# Altium integrated library WCAP-ATLL_rev15a.intlib: 209 symbols (part 1 of 3) (continued)
## WCAP-ATLL 16x31.5x7.5x0.8 860160280048 (continued)
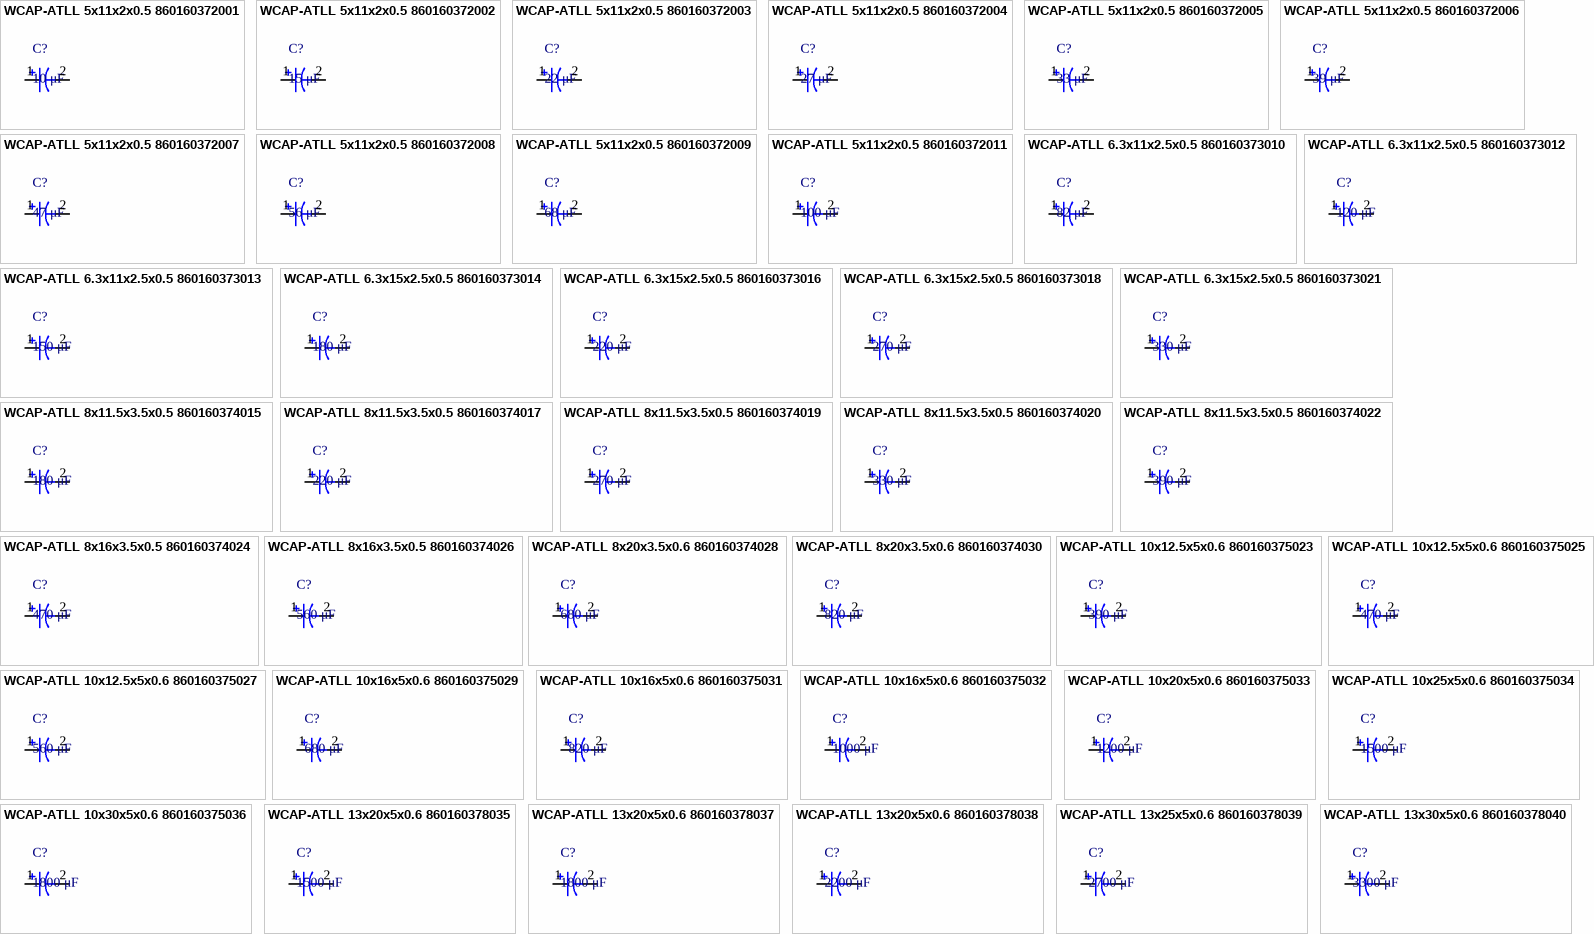
[diagram p2: symbols WCAP-ATLL 5x11x2x0.5 860160372001 to WCAP-ATLL 13x30x5x0.6 860160378040]

## WCAP-ATLL 5x11x2x0.5 860160372001
designator C?, comment 10 μF
WCAP-ATLL Aluminum Electrolytic Capacitors , 10 μF; + / - 20%; 16 V , 5 x 11; Manufacturer: Wurth Elektronik; partNo: 860160372001; E-mail: libraries@we-online.com; Characteristics: Aluminum Electrolytic Capacitor;Recommended soldering: Wave;Operating temperature: –55 °C to +105 °C;Low impedance and high temperature product series;Load life: 3000–10000 h @ +105 °C; ComponentLink1Description: Manufacturer; ComponentLink1URL: http://www.we-online.com; ComponentLink2Description: Datasheet; ComponentLink2URL: http://katalog.we-online.de/pbs/datasheet/860160372001.pdf; Created by: Karrer Zheng; Created Date: 5/13/2015; Capacitance: 10 μF; Application: Used in circuit with rigorous conditions and high ambient temperature;  applied to the secondary side output filtering loop, used in switching power supply with higher operating temperature, DC-DC converter, AC-DC converter, adapter, charger, TV, VCR, DC motor circuit filter, high-end switching power supply, LCD TV, energy saving lamps, electronic ballast, LED lamp and etc.
footprint WCAP-ATLL 5x11x2x0.5
pins: 1, 2

## WCAP-ATLL 5x11x2x0.5 860160372002
designator C?, comment 15 μF
WCAP-ATLL Aluminum Electrolytic Capacitors , 15 μF; + / - 20%; 16 V , 5 x 11; Manufacturer: Wurth Elektronik; partNo: 860160372002; E-mail: libraries@we-online.com; Characteristics: Aluminum Electrolytic Capacitor;Recommended soldering: Wave;Operating temperature: –55 °C to +105 °C;Low impedance and high temperature product series;Load life: 3000–10000 h @ +105 °C; ComponentLink1Description: Manufacturer; ComponentLink1URL: http://www.we-online.com; ComponentLink2Description: Datasheet; ComponentLink2URL: http://katalog.we-online.de/pbs/datasheet/860160372002.pdf; Created by: Karrer Zheng; Created Date: 5/13/2015; Capacitance: 15 μF; Application: Used in circuit with rigorous conditions and high ambient temperature;  applied to the secondary side output filtering loop, used in switching power supply with higher operating temperature, DC-DC converter, AC-DC converter, adapter, charger, TV, VCR, DC motor circuit filter, high-end switching power supply, LCD TV, energy saving lamps, electronic ballast, LED lamp and etc.
footprint WCAP-ATLL 5x11x2x0.5
pins: 1, 2

## WCAP-ATLL 5x11x2x0.5 860160372003
designator C?, comment 22 μF
WCAP-ATLL Aluminum Electrolytic Capacitors , 22 μF; + / - 20%; 16 V , 5 x 11; Manufacturer: Wurth Elektronik; partNo: 860160372003; E-mail: libraries@we-online.com; Characteristics: Aluminum Electrolytic Capacitor;Recommended soldering: Wave;Operating temperature: –55 °C to +105 °C;Low impedance and high temperature product series;Load life: 3000–10000 h @ +105 °C; ComponentLink1Description: Manufacturer; ComponentLink1URL: http://www.we-online.com; ComponentLink2Description: Datasheet; ComponentLink2URL: http://katalog.we-online.de/pbs/datasheet/860160372003.pdf; Created by: Karrer Zheng; Created Date: 5/13/2015; Capacitance: 22 μF; Application: Used in circuit with rigorous conditions and high ambient temperature;  applied to the secondary side output filtering loop, used in switching power supply with higher operating temperature, DC-DC converter, AC-DC converter, adapter, charger, TV, VCR, DC motor circuit filter, high-end switching power supply, LCD TV, energy saving lamps, electronic ballast, LED lamp and etc.
footprint WCAP-ATLL 5x11x2x0.5
pins: 1, 2

## WCAP-ATLL 5x11x2x0.5 860160372004
designator C?, comment 27 μF
WCAP-ATLL Aluminum Electrolytic Capacitors , 27 μF; + / - 20%; 16 V , 5 x 11; Manufacturer: Wurth Elektronik; partNo: 860160372004; E-mail: libraries@we-online.com; Characteristics: Aluminum Electrolytic Capacitor;Recommended soldering: Wave;Operating temperature: –55 °C to +105 °C;Low impedance and high temperature product series;Load life: 3000–10000 h @ +105 °C; ComponentLink1Description: Manufacturer; ComponentLink1URL: http://www.we-online.com; ComponentLink2Description: Datasheet; ComponentLink2URL: http://katalog.we-online.de/pbs/datasheet/860160372004.pdf; Created by: Karrer Zheng; Created Date: 5/13/2015; Capacitance: 27 μF; Application: Used in circuit with rigorous conditions and high ambient temperature;  applied to the secondary side output filtering loop, used in switching power supply with higher operating temperature, DC-DC converter, AC-DC converter, adapter, charger, TV, VCR, DC motor circuit filter, high-end switching power supply, LCD TV, energy saving lamps, electronic ballast, LED lamp and etc.
footprint WCAP-ATLL 5x11x2x0.5
pins: 1, 2

## WCAP-ATLL 5x11x2x0.5 860160372005
designator C?, comment 33 μF
WCAP-ATLL Aluminum Electrolytic Capacitors , 33 μF; + / - 20%; 16 V , 5 x 11; Manufacturer: Wurth Elektronik; partNo: 860160372005; E-mail: libraries@we-online.com; Characteristics: Aluminum Electrolytic Capacitor;Recommended soldering: Wave;Operating temperature: –55 °C to +105 °C;Low impedance and high temperature product series;Load life: 3000–10000 h @ +105 °C; ComponentLink1Description: Manufacturer; ComponentLink1URL: http://www.we-online.com; ComponentLink2Description: Datasheet; ComponentLink2URL: http://katalog.we-online.de/pbs/datasheet/860160372005.pdf; Created by: Karrer Zheng; Created Date: 5/13/2015; Capacitance: 33 μF; Application: Used in circuit with rigorous conditions and high ambient temperature;  applied to the secondary side output filtering loop, used in switching power supply with higher operating temperature, DC-DC converter, AC-DC converter, adapter, charger, TV, VCR, DC motor circuit filter, high-end switching power supply, LCD TV, energy saving lamps, electronic ballast, LED lamp and etc.
footprint WCAP-ATLL 5x11x2x0.5
pins: 1, 2

## WCAP-ATLL 5x11x2x0.5 860160372006
designator C?, comment 39 μF
WCAP-ATLL Aluminum Electrolytic Capacitors , 39 μF; + / - 20%; 16 V , 5 x 11; Manufacturer: Wurth Elektronik; partNo: 860160372006; E-mail: libraries@we-online.com; Characteristics: Aluminum Electrolytic Capacitor;Recommended soldering: Wave;Operating temperature: –55 °C to +105 °C;Low impedance and high temperature product series;Load life: 3000–10000 h @ +105 °C; ComponentLink1Description: Manufacturer; ComponentLink1URL: http://www.we-online.com; ComponentLink2Description: Datasheet; ComponentLink2URL: http://katalog.we-online.de/pbs/datasheet/860160372006.pdf; Created by: Karrer Zheng; Created Date: 5/13/2015; Capacitance: 39 μF; Application: Used in circuit with rigorous conditions and high ambient temperature;  applied to the secondary side output filtering loop, used in switching power supply with higher operating temperature, DC-DC converter, AC-DC converter, adapter, charger, TV, VCR, DC motor circuit filter, high-end switching power supply, LCD TV, energy saving lamps, electronic ballast, LED lamp and etc.
footprint WCAP-ATLL 5x11x2x0.5
pins: 1, 2

## WCAP-ATLL 5x11x2x0.5 860160372007
designator C?, comment 47 μF
WCAP-ATLL Aluminum Electrolytic Capacitors , 47 μF; + / - 20%; 16 V , 5 x 11; Manufacturer: Wurth Elektronik; partNo: 860160372007; E-mail: libraries@we-online.com; Characteristics: Aluminum Electrolytic Capacitor;Recommended soldering: Wave;Operating temperature: –55 °C to +105 °C;Low impedance and high temperature product series;Load life: 3000–10000 h @ +105 °C; ComponentLink1Description: Manufacturer; ComponentLink1URL: http://www.we-online.com; ComponentLink2Description: Datasheet; ComponentLink2URL: http://katalog.we-online.de/pbs/datasheet/860160372007.pdf; Created by: Karrer Zheng; Created Date: 5/13/2015; Capacitance: 47 μF; Application: Used in circuit with rigorous conditions and high ambient temperature;  applied to the secondary side output filtering loop, used in switching power supply with higher operating temperature, DC-DC converter, AC-DC converter, adapter, charger, TV, VCR, DC motor circuit filter, high-end switching power supply, LCD TV, energy saving lamps, electronic ballast, LED lamp and etc.
footprint WCAP-ATLL 5x11x2x0.5
pins: 1, 2

## WCAP-ATLL 5x11x2x0.5 860160372008
designator C?, comment 56 μF
WCAP-ATLL Aluminum Electrolytic Capacitors , 56 μF; + / - 20%; 16 V , 5 x 11; Manufacturer: Wurth Elektronik; partNo: 860160372008; E-mail: libraries@we-online.com; Characteristics: Aluminum Electrolytic Capacitor;Recommended soldering: Wave;Operating temperature: –55 °C to +105 °C;Low impedance and high temperature product series;Load life: 3000–10000 h @ +105 °C; ComponentLink1Description: Manufacturer; ComponentLink1URL: http://www.we-online.com; ComponentLink2Description: Datasheet; ComponentLink2URL: http://katalog.we-online.de/pbs/datasheet/860160372008.pdf; Created by: Karrer Zheng; Created Date: 5/13/2015; Capacitance: 56 μF; Application: Used in circuit with rigorous conditions and high ambient temperature;  applied to the secondary side output filtering loop, used in switching power supply with higher operating temperature, DC-DC converter, AC-DC converter, adapter, charger, TV, VCR, DC motor circuit filter, high-end switching power supply, LCD TV, energy saving lamps, electronic ballast, LED lamp and etc.
footprint WCAP-ATLL 5x11x2x0.5
pins: 1, 2

## WCAP-ATLL 5x11x2x0.5 860160372009
designator C?, comment 68 μF
WCAP-ATLL Aluminum Electrolytic Capacitors , 68 μF; + / - 20%; 16 V , 5 x 11; Manufacturer: Wurth Elektronik; partNo: 860160372009; E-mail: libraries@we-online.com; Characteristics: Aluminum Electrolytic Capacitor;Recommended soldering: Wave;Operating temperature: –55 °C to +105 °C;Low impedance and high temperature product series;Load life: 3000–10000 h @ +105 °C; ComponentLink1Description: Manufacturer; ComponentLink1URL: http://www.we-online.com; ComponentLink2Description: Datasheet; ComponentLink2URL: http://katalog.we-online.de/pbs/datasheet/860160372009.pdf; Created by: Karrer Zheng; Created Date: 5/13/2015; Capacitance: 68 μF; Application: Used in circuit with rigorous conditions and high ambient temperature;  applied to the secondary side output filtering loop, used in switching power supply with higher operating temperature, DC-DC converter, AC-DC converter, adapter, charger, TV, VCR, DC motor circuit filter, high-end switching power supply, LCD TV, energy saving lamps, electronic ballast, LED lamp and etc.
footprint WCAP-ATLL 5x11x2x0.5
pins: 1, 2

## WCAP-ATLL 5x11x2x0.5 860160372011
designator C?, comment 100 μF
WCAP-ATLL Aluminum Electrolytic Capacitors , 100 μF; + / - 20%; 16 V , 5 x 11; Manufacturer: Wurth Elektronik; partNo: 860160372011; E-mail: libraries@we-online.com; Characteristics: Aluminum Electrolytic Capacitor;Recommended soldering: Wave;Operating temperature: –55 °C to +105 °C;Low impedance and high temperature product series;Load life: 3000–10000 h @ +105 °C; ComponentLink1Description: Manufacturer; ComponentLink1URL: http://www.we-online.com; ComponentLink2Description: Datasheet; ComponentLink2URL: http://katalog.we-online.de/pbs/datasheet/860160372011.pdf; Created by: Karrer Zheng; Created Date: 5/13/2015; Capacitance: 100 μF; Application: Used in circuit with rigorous conditions and high ambient temperature;  applied to the secondary side output filtering loop, used in switching power supply with higher operating temperature, DC-DC converter, AC-DC converter, adapter, charger, TV, VCR, DC motor circuit filter, high-end switching power supply, LCD TV, energy saving lamps, electronic ballast, LED lamp and etc.
footprint WCAP-ATLL 5x11x2x0.5
pins: 1, 2

## WCAP-ATLL 6.3x11x2.5x0.5 860160373010
designator C?, comment 82 μF
WCAP-ATLL Aluminum Electrolytic Capacitors , 82 μF; + / - 20%; 16 V , 6,3 x 11; Manufacturer: Wurth Elektronik; partNo: 860160373010; E-mail: libraries@we-online.com; Characteristics: Aluminum Electrolytic Capacitor;Recommended soldering: Wave;Operating temperature: –55 °C to +105 °C;Low impedance and high temperature product series;Load life: 3000–10000 h @ +105 °C; ComponentLink1Description: Manufacturer; ComponentLink1URL: http://www.we-online.com; ComponentLink2Description: Datasheet; ComponentLink2URL: http://katalog.we-online.de/pbs/datasheet/860160373010.pdf; Created by: Karrer Zheng; Created Date: 5/13/2015; Capacitance: 82 μF; Application: Used in circuit with rigorous conditions and high ambient temperature;  applied to the secondary side output filtering loop, used in switching power supply with higher operating temperature, DC-DC converter, AC-DC converter, adapter, charger, TV, VCR, DC motor circuit filter, high-end switching power supply, LCD TV, energy saving lamps, electronic ballast, LED lamp and etc.
footprint WCAP-ATLL 6.3x11x2.5x0.5
pins: 1, 2

## WCAP-ATLL 6.3x11x2.5x0.5 860160373012
designator C?, comment 120 μF
WCAP-ATLL Aluminum Electrolytic Capacitors , 120 μF; + / - 20%; 16 V , 6,3 x 11; Manufacturer: Wurth Elektronik; partNo: 860160373012; E-mail: libraries@we-online.com; Characteristics: Aluminum Electrolytic Capacitor;Recommended soldering: Wave;Operating temperature: –55 °C to +105 °C;Low impedance and high temperature product series;Load life: 3000–10000 h @ +105 °C; ComponentLink1Description: Manufacturer; ComponentLink1URL: http://www.we-online.com; ComponentLink2Description: Datasheet; ComponentLink2URL: http://katalog.we-online.de/pbs/datasheet/860160373012.pdf; Created by: Karrer Zheng; Created Date: 5/13/2015; Capacitance: 120 μF; Application: Used in circuit with rigorous conditions and high ambient temperature;  applied to the secondary side output filtering loop, used in switching power supply with higher operating temperature, DC-DC converter, AC-DC converter, adapter, charger, TV, VCR, DC motor circuit filter, high-end switching power supply, LCD TV, energy saving lamps, electronic ballast, LED lamp and etc.
footprint WCAP-ATLL 6.3x11x2.5x0.5
pins: 1, 2

## WCAP-ATLL 6.3x11x2.5x0.5 860160373013
designator C?, comment 150 μF
WCAP-ATLL Aluminum Electrolytic Capacitors , 150 μF; + / - 20%; 16 V , 6,3 x 11; Manufacturer: Wurth Elektronik; partNo: 860160373013; E-mail: libraries@we-online.com; Characteristics: Aluminum Electrolytic Capacitor;Recommended soldering: Wave;Operating temperature: –55 °C to +105 °C;Low impedance and high temperature product series;Load life: 3000–10000 h @ +105 °C; ComponentLink1Description: Manufacturer; ComponentLink1URL: http://www.we-online.com; ComponentLink2Description: Datasheet; ComponentLink2URL: http://katalog.we-online.de/pbs/datasheet/860160373013.pdf; Created by: Karrer Zheng; Created Date: 5/13/2015; Capacitance: 150 μF; Application: Used in circuit with rigorous conditions and high ambient temperature;  applied to the secondary side output filtering loop, used in switching power supply with higher operating temperature, DC-DC converter, AC-DC converter, adapter, charger, TV, VCR, DC motor circuit filter, high-end switching power supply, LCD TV, energy saving lamps, electronic ballast, LED lamp and etc.
footprint WCAP-ATLL 6.3x11x2.5x0.5
pins: 1, 2

## WCAP-ATLL 6.3x15x2.5x0.5 860160373014
designator C?, comment 180 μF
WCAP-ATLL Aluminum Electrolytic Capacitors , 180 μF; + / - 20%; 16 V , 6,3 x 15; Manufacturer: Wurth Elektronik; partNo: 860160373014; E-mail: libraries@we-online.com; Characteristics: Aluminum Electrolytic Capacitor;Recommended soldering: Wave;Operating temperature: –55 °C to +105 °C;Low impedance and high temperature product series;Load life: 3000–10000 h @ +105 °C; ComponentLink1Description: Manufacturer; ComponentLink1URL: http://www.we-online.com; ComponentLink2Description: Datasheet; ComponentLink2URL: http://katalog.we-online.de/pbs/datasheet/860160373014.pdf; Created by: Karrer Zheng; Created Date: 5/13/2015; Capacitance: 180 μF; Application: Used in circuit with rigorous conditions and high ambient temperature;  applied to the secondary side output filtering loop, used in switching power supply with higher operating temperature, DC-DC converter, AC-DC converter, adapter, charger, TV, VCR, DC motor circuit filter, high-end switching power supply, LCD TV, energy saving lamps, electronic ballast, LED lamp and etc.
footprint WCAP-ATLL 6.3x15x2.5x0.5
pins: 1, 2

## WCAP-ATLL 6.3x15x2.5x0.5 860160373016
designator C?, comment 220 μF
WCAP-ATLL Aluminum Electrolytic Capacitors , 220 μF; + / - 20%; 16 V , 6,3 x 15; Manufacturer: Wurth Elektronik; partNo: 860160373016; E-mail: libraries@we-online.com; Characteristics: Aluminum Electrolytic Capacitor;Recommended soldering: Wave;Operating temperature: –55 °C to +105 °C;Low impedance and high temperature product series;Load life: 3000–10000 h @ +105 °C; ComponentLink1Description: Manufacturer; ComponentLink1URL: http://www.we-online.com; ComponentLink2Description: Datasheet; ComponentLink2URL: http://katalog.we-online.de/pbs/datasheet/860160373016.pdf; Created by: Karrer Zheng; Created Date: 5/13/2015; Capacitance: 220 μF; Application: Used in circuit with rigorous conditions and high ambient temperature;  applied to the secondary side output filtering loop, used in switching power supply with higher operating temperature, DC-DC converter, AC-DC converter, adapter, charger, TV, VCR, DC motor circuit filter, high-end switching power supply, LCD TV, energy saving lamps, electronic ballast, LED lamp and etc.
footprint WCAP-ATLL 6.3x15x2.5x0.5
pins: 1, 2

## WCAP-ATLL 6.3x15x2.5x0.5 860160373018
designator C?, comment 270 μF
WCAP-ATLL Aluminum Electrolytic Capacitors , 270 μF; + / - 20%; 16 V , 6,3 x 15; Manufacturer: Wurth Elektronik; partNo: 860160373018; E-mail: libraries@we-online.com; Characteristics: Aluminum Electrolytic Capacitor;Recommended soldering: Wave;Operating temperature: –55 °C to +105 °C;Low impedance and high temperature product series;Load life: 3000–10000 h @ +105 °C; ComponentLink1Description: Manufacturer; ComponentLink1URL: http://www.we-online.com; ComponentLink2Description: Datasheet; ComponentLink2URL: http://katalog.we-online.de/pbs/datasheet/860160373018.pdf; Created by: Karrer Zheng; Created Date: 5/13/2015; Capacitance: 270 μF; Application: Used in circuit with rigorous conditions and high ambient temperature;  applied to the secondary side output filtering loop, used in switching power supply with higher operating temperature, DC-DC converter, AC-DC converter, adapter, charger, TV, VCR, DC motor circuit filter, high-end switching power supply, LCD TV, energy saving lamps, electronic ballast, LED lamp and etc.
footprint WCAP-ATLL 6.3x15x2.5x0.5
pins: 1, 2

## WCAP-ATLL 6.3x15x2.5x0.5 860160373021
designator C?, comment 330 μF
WCAP-ATLL Aluminum Electrolytic Capacitors , 330 μF; + / - 20%; 16 V , 6,3 x 15; Manufacturer: Wurth Elektronik; partNo: 860160373021; E-mail: libraries@we-online.com; Characteristics: Aluminum Electrolytic Capacitor;Recommended soldering: Wave;Operating temperature: –55 °C to +105 °C;Low impedance and high temperature product series;Load life: 3000–10000 h @ +105 °C; ComponentLink1Description: Manufacturer; ComponentLink1URL: http://www.we-online.com; ComponentLink2Description: Datasheet; ComponentLink2URL: http://katalog.we-online.de/pbs/datasheet/860160373021.pdf; Created by: Karrer Zheng; Created Date: 5/13/2015; Capacitance: 330 μF; Application: Used in circuit with rigorous conditions and high ambient temperature;  applied to the secondary side output filtering loop, used in switching power supply with higher operating temperature, DC-DC converter, AC-DC converter, adapter, charger, TV, VCR, DC motor circuit filter, high-end switching power supply, LCD TV, energy saving lamps, electronic ballast, LED lamp and etc.
footprint WCAP-ATLL 6.3x15x2.5x0.5
pins: 1, 2

## WCAP-ATLL 8x11.5x3.5x0.5 860160374015
designator C?, comment 180 μF
WCAP-ATLL Aluminum Electrolytic Capacitors , 180 μF; + / - 20%; 16 V , 8 x 11,5; Manufacturer: Wurth Elektronik; partNo: 860160374015; E-mail: libraries@we-online.com; Characteristics: Aluminum Electrolytic Capacitor;Recommended soldering: Wave;Operating temperature: –55 °C to +105 °C;Low impedance and high temperature product series;Load life: 3000–10000 h @ +105 °C; ComponentLink1Description: Manufacturer; ComponentLink1URL: http://www.we-online.com; ComponentLink2Description: Datasheet; ComponentLink2URL: http://katalog.we-online.de/pbs/datasheet/860160374015.pdf; Created by: Karrer Zheng; Created Date: 5/13/2015; Capacitance: 180 μF; Application: Used in circuit with rigorous conditions and high ambient temperature;  applied to the secondary side output filtering loop, used in switching power supply with higher operating temperature, DC-DC converter, AC-DC converter, adapter, charger, TV, VCR, DC motor circuit filter, high-end switching power supply, LCD TV, energy saving lamps, electronic ballast, LED lamp and etc.
footprint WCAP-ATLL 8x11.5x3.5x0.5
pins: 1, 2

## WCAP-ATLL 8x11.5x3.5x0.5 860160374017
designator C?, comment 220 μF
WCAP-ATLL Aluminum Electrolytic Capacitors , 220 μF; + / - 20%; 16 V , 8 x 11,5; Manufacturer: Wurth Elektronik; partNo: 860160374017; E-mail: libraries@we-online.com; Characteristics: Aluminum Electrolytic Capacitor;Recommended soldering: Wave;Operating temperature: –55 °C to +105 °C;Low impedance and high temperature product series;Load life: 3000–10000 h @ +105 °C; ComponentLink1Description: Manufacturer; ComponentLink1URL: http://www.we-online.com; ComponentLink2Description: Datasheet; ComponentLink2URL: http://katalog.we-online.de/pbs/datasheet/860160374017.pdf; Created by: Karrer Zheng; Created Date: 5/13/2015; Capacitance: 220 μF; Application: Used in circuit with rigorous conditions and high ambient temperature;  applied to the secondary side output filtering loop, used in switching power supply with higher operating temperature, DC-DC converter, AC-DC converter, adapter, charger, TV, VCR, DC motor circuit filter, high-end switching power supply, LCD TV, energy saving lamps, electronic ballast, LED lamp and etc.
footprint WCAP-ATLL 8x11.5x3.5x0.5
pins: 1, 2

## WCAP-ATLL 8x11.5x3.5x0.5 860160374019
designator C?, comment 270 μF
WCAP-ATLL Aluminum Electrolytic Capacitors , 270 μF; + / - 20%; 16 V , 8 x 11,5; Manufacturer: Wurth Elektronik; partNo: 860160374019; E-mail: libraries@we-online.com; Characteristics: Aluminum Electrolytic Capacitor;Recommended soldering: Wave;Operating temperature: –55 °C to +105 °C;Low impedance and high temperature product series;Load life: 3000–10000 h @ +105 °C; ComponentLink1Description: Manufacturer; ComponentLink1URL: http://www.we-online.com; ComponentLink2Description: Datasheet; ComponentLink2URL: http://katalog.we-online.de/pbs/datasheet/860160374019.pdf; Created by: Karrer Zheng; Created Date: 5/13/2015; Capacitance: 270 μF; Application: Used in circuit with rigorous conditions and high ambient temperature;  applied to the secondary side output filtering loop, used in switching power supply with higher operating temperature, DC-DC converter, AC-DC converter, adapter, charger, TV, VCR, DC motor circuit filter, high-end switching power supply, LCD TV, energy saving lamps, electronic ballast, LED lamp and etc.
footprint WCAP-ATLL 8x11.5x3.5x0.5
pins: 1, 2

## WCAP-ATLL 8x11.5x3.5x0.5 860160374020
designator C?, comment 330 μF
WCAP-ATLL Aluminum Electrolytic Capacitors , 330 μF; + / - 20%; 16 V , 8 x 11,5; Manufacturer: Wurth Elektronik; partNo: 860160374020; E-mail: libraries@we-online.com; Characteristics: Aluminum Electrolytic Capacitor;Recommended soldering: Wave;Operating temperature: –55 °C to +105 °C;Low impedance and high temperature product series;Load life: 3000–10000 h @ +105 °C; ComponentLink1Description: Manufacturer; ComponentLink1URL: http://www.we-online.com; ComponentLink2Description: Datasheet; ComponentLink2URL: http://katalog.we-online.de/pbs/datasheet/860160374020.pdf; Created by: Karrer Zheng; Created Date: 5/13/2015; Capacitance: 330 μF; Application: Used in circuit with rigorous conditions and high ambient temperature;  applied to the secondary side output filtering loop, used in switching power supply with higher operating temperature, DC-DC converter, AC-DC converter, adapter, charger, TV, VCR, DC motor circuit filter, high-end switching power supply, LCD TV, energy saving lamps, electronic ballast, LED lamp and etc.
footprint WCAP-ATLL 8x11.5x3.5x0.5
pins: 1, 2

## WCAP-ATLL 8x11.5x3.5x0.5 860160374022
designator C?, comment 390 μF
WCAP-ATLL Aluminum Electrolytic Capacitors , 390 μF; + / - 20%; 16 V , 8 x 11,5; Manufacturer: Wurth Elektronik; partNo: 860160374022; E-mail: libraries@we-online.com; Characteristics: Aluminum Electrolytic Capacitor;Recommended soldering: Wave;Operating temperature: –55 °C to +105 °C;Low impedance and high temperature product series;Load life: 3000–10000 h @ +105 °C; ComponentLink1Description: Manufacturer; ComponentLink1URL: http://www.we-online.com; ComponentLink2Description: Datasheet; ComponentLink2URL: http://katalog.we-online.de/pbs/datasheet/860160374022.pdf; Created by: Karrer Zheng; Created Date: 5/13/2015; Capacitance: 390 μF; Application: Used in circuit with rigorous conditions and high ambient temperature;  applied to the secondary side output filtering loop, used in switching power supply with higher operating temperature, DC-DC converter, AC-DC converter, adapter, charger, TV, VCR, DC motor circuit filter, high-end switching power supply, LCD TV, energy saving lamps, electronic ballast, LED lamp and etc.
footprint WCAP-ATLL 8x11.5x3.5x0.5
pins: 1, 2

## WCAP-ATLL 8x16x3.5x0.5 860160374024
designator C?, comment 470 μF
WCAP-ATLL Aluminum Electrolytic Capacitors , 470 μF; + / - 20%; 16 V , 8 x 16; Manufacturer: Wurth Elektronik; partNo: 860160374024; E-mail: libraries@we-online.com; Characteristics: Aluminum Electrolytic Capacitor;Recommended soldering: Wave;Operating temperature: –55 °C to +105 °C;Low impedance and high temperature product series;Load life: 3000–10000 h @ +105 °C; ComponentLink1Description: Manufacturer; ComponentLink1URL: http://www.we-online.com; ComponentLink2Description: Datasheet; ComponentLink2URL: http://katalog.we-online.de/pbs/datasheet/860160374024.pdf; Created by: Karrer Zheng; Created Date: 5/13/2015; Capacitance: 470 μF; Application: Used in circuit with rigorous conditions and high ambient temperature;  applied to the secondary side output filtering loop, used in switching power supply with higher operating temperature, DC-DC converter, AC-DC converter, adapter, charger, TV, VCR, DC motor circuit filter, high-end switching power supply, LCD TV, energy saving lamps, electronic ballast, LED lamp and etc.
footprint WCAP-ATLL 8x16x3.5x0.5
pins: 1, 2

## WCAP-ATLL 8x16x3.5x0.5 860160374026
designator C?, comment 560 μF
WCAP-ATLL Aluminum Electrolytic Capacitors , 560 μF; + / - 20%; 16 V , 8 x 16; Manufacturer: Wurth Elektronik; partNo: 860160374026; E-mail: libraries@we-online.com; Characteristics: Aluminum Electrolytic Capacitor;Recommended soldering: Wave;Operating temperature: –55 °C to +105 °C;Low impedance and high temperature product series;Load life: 3000–10000 h @ +105 °C; ComponentLink1Description: Manufacturer; ComponentLink1URL: http://www.we-online.com; ComponentLink2Description: Datasheet; ComponentLink2URL: http://katalog.we-online.de/pbs/datasheet/860160374026.pdf; Created by: Karrer Zheng; Created Date: 5/13/2015; Capacitance: 560 μF; Application: Used in circuit with rigorous conditions and high ambient temperature;  applied to the secondary side output filtering loop, used in switching power supply with higher operating temperature, DC-DC converter, AC-DC converter, adapter, charger, TV, VCR, DC motor circuit filter, high-end switching power supply, LCD TV, energy saving lamps, electronic ballast, LED lamp and etc.
footprint WCAP-ATLL 8x16x3.5x0.5
pins: 1, 2

## WCAP-ATLL 8x20x3.5x0.6 860160374028
designator C?, comment 680 μF
WCAP-ATLL Aluminum Electrolytic Capacitors , 680 μF; + / - 20%; 16 V , 8 x 20; Manufacturer: Wurth Elektronik; partNo: 860160374028; E-mail: libraries@we-online.com; Characteristics: Aluminum Electrolytic Capacitor;Recommended soldering: Wave;Operating temperature: –55 °C to +105 °C;Low impedance and high temperature product series;Load life: 3000–10000 h @ +105 °C; ComponentLink1Description: Manufacturer; ComponentLink1URL: http://www.we-online.com; ComponentLink2Description: Datasheet; ComponentLink2URL: http://katalog.we-online.de/pbs/datasheet/860160374028.pdf; Created by: Karrer Zheng; Created Date: 5/13/2015; Capacitance: 680 μF; Application: Used in circuit with rigorous conditions and high ambient temperature;  applied to the secondary side output filtering loop, used in switching power supply with higher operating temperature, DC-DC converter, AC-DC converter, adapter, charger, TV, VCR, DC motor circuit filter, high-end switching power supply, LCD TV, energy saving lamps, electronic ballast, LED lamp and etc.
footprint WCAP-ATLL 8x20x3.5x0.6
pins: 1, 2

## WCAP-ATLL 8x20x3.5x0.6 860160374030
designator C?, comment 820 μF
WCAP-ATLL Aluminum Electrolytic Capacitors , 820 μF; + / - 20%; 16 V , 8 x 20; Manufacturer: Wurth Elektronik; partNo: 860160374030; E-mail: libraries@we-online.com; Characteristics: Aluminum Electrolytic Capacitor;Recommended soldering: Wave;Operating temperature: –55 °C to +105 °C;Low impedance and high temperature product series;Load life: 3000–10000 h @ +105 °C; ComponentLink1Description: Manufacturer; ComponentLink1URL: http://www.we-online.com; ComponentLink2Description: Datasheet; ComponentLink2URL: http://katalog.we-online.de/pbs/datasheet/860160374030.pdf; Created by: Karrer Zheng; Created Date: 5/13/2015; Capacitance: 820 μF; Application: Used in circuit with rigorous conditions and high ambient temperature;  applied to the secondary side output filtering loop, used in switching power supply with higher operating temperature, DC-DC converter, AC-DC converter, adapter, charger, TV, VCR, DC motor circuit filter, high-end switching power supply, LCD TV, energy saving lamps, electronic ballast, LED lamp and etc.
footprint WCAP-ATLL 8x20x3.5x0.6
pins: 1, 2

## WCAP-ATLL 10x12.5x5x0.6 860160375023
designator C?, comment 390 μF
WCAP-ATLL Aluminum Electrolytic Capacitors , 390 μF; + / - 20%; 16 V , 10 x 12,5; Manufacturer: Wurth Elektronik; partNo: 860160375023; E-mail: libraries@we-online.com; Characteristics: Aluminum Electrolytic Capacitor;Recommended soldering: Wave;Operating temperature: –55 °C to +105 °C;Low impedance and high temperature product series;Load life: 3000–10000 h @ +105 °C; ComponentLink1Description: Manufacturer; ComponentLink1URL: http://www.we-online.com; ComponentLink2Description: Datasheet; ComponentLink2URL: http://katalog.we-online.de/pbs/datasheet/860160375023.pdf; Created by: Karrer Zheng; Created Date: 5/13/2015; Capacitance: 390 μF; Application: Used in circuit with rigorous conditions and high ambient temperature;  applied to the secondary side output filtering loop, used in switching power supply with higher operating temperature, DC-DC converter, AC-DC converter, adapter, charger, TV, VCR, DC motor circuit filter, high-end switching power supply, LCD TV, energy saving lamps, electronic ballast, LED lamp and etc.
footprint WCAP-ATLL 10x12.5x5x0.6
pins: 1, 2
